# Altium footprint library mylib.PcbLib: 82 footprints (part 2 of 6)
Each footprint in its own frame and in the unit in brackets; x right, y up, seen from the top. Pads: shape width x height; smd on the part's side, far side on the other; paste and mask are expansions set on the pad; w line width, h text height; cw(c..) or ccw(c..) is an arc to the next point about the centre after c.
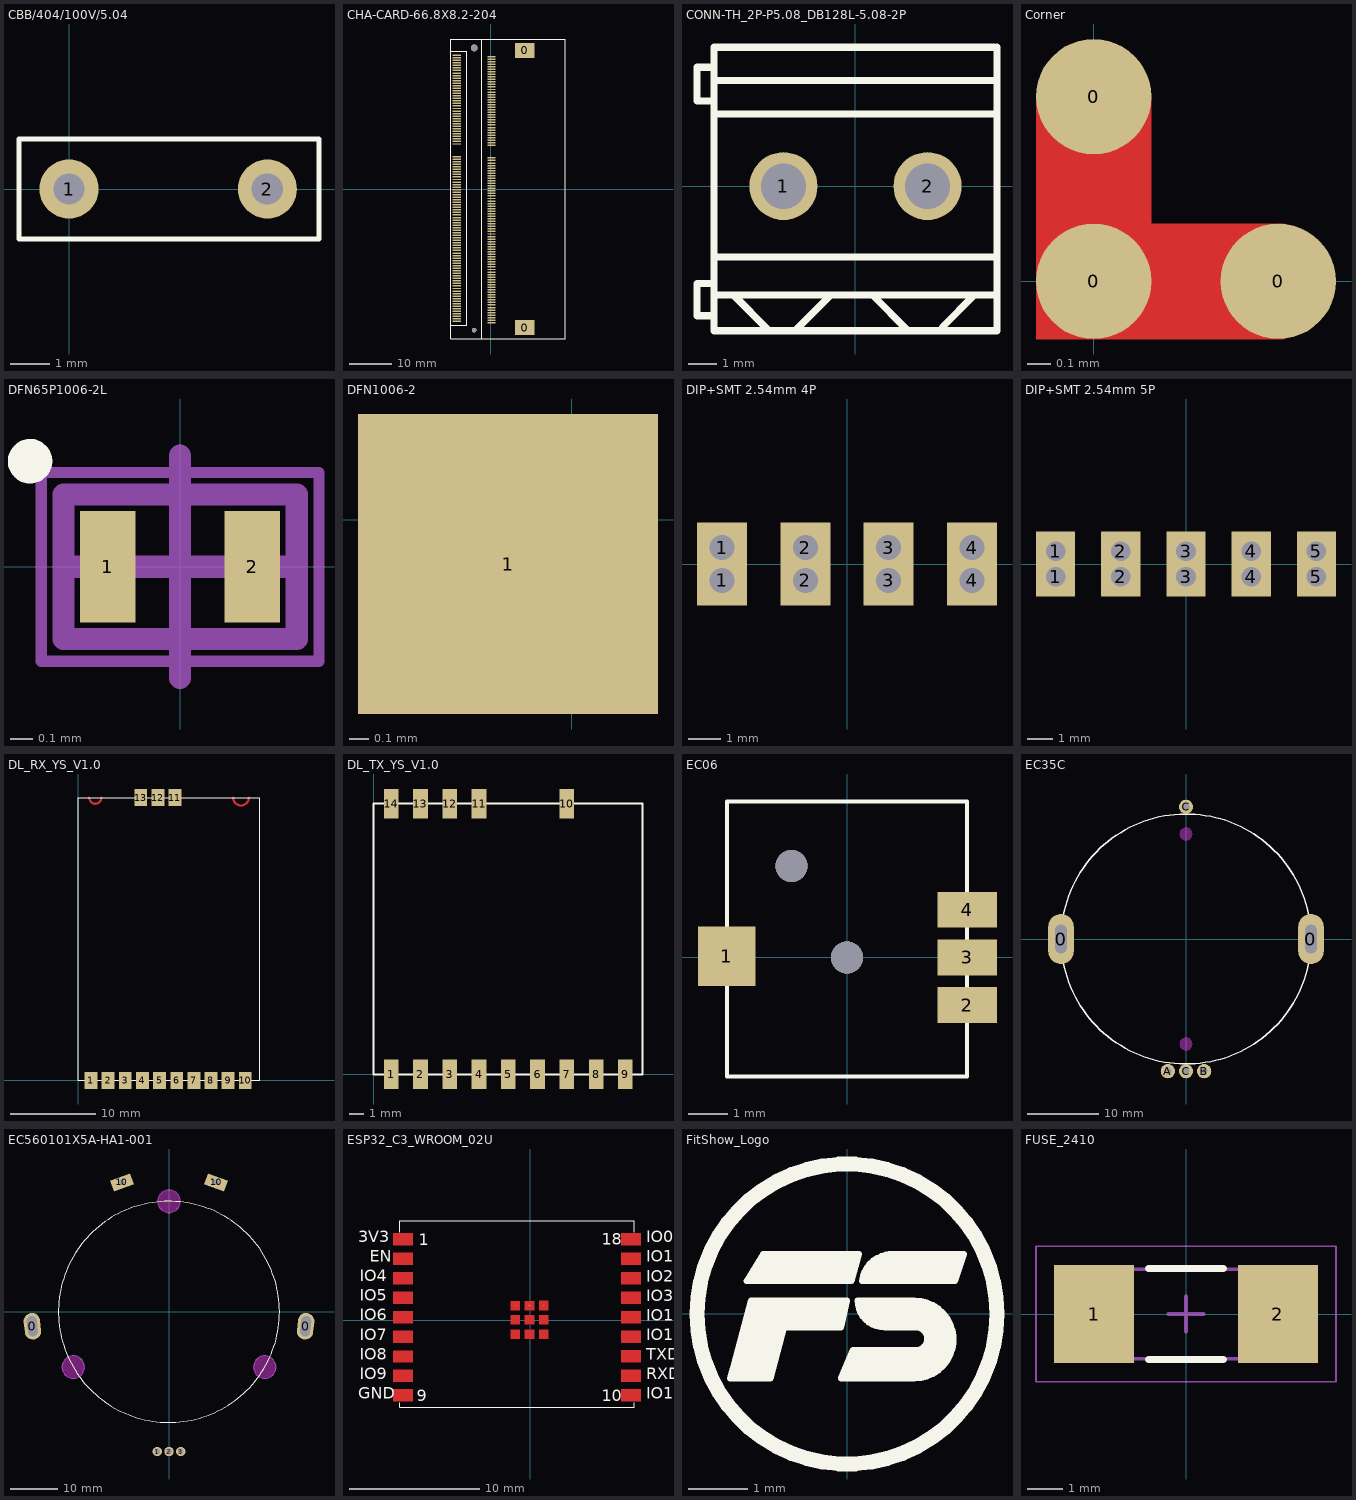
[diagram p1: the footprints below, top view; thin cyan lines are the x and y axes]

## CBB/404/100V/5.04 [mm]
pads (2):
  round 1.5 hole 0.8: 1(0,0) 2(5.04,0)
Top Overlay:
  lines w0.127: -1.27,-1.27 6.35,-1.27 6.35,1.27 -1.27,1.27 -1.27,-1.27

## CHA-CARD-66.8X8.2-204 [mm]
pads (208):
  rect 4.6x3.5 smd: 0(8.05,-32.8) 0(8.05,32.801)
  rect 2x0.35 smd: 1(-8.05,31.65) 2(0.15,31.351) 3(-8.05,31.05) 4(0.15,30.75) 5(-8.05,30.45) 6(0.15,30.149) 7(-8.05,29.85) 8(0.15,29.55) 9(-8.05,29.25) 10(0.15,28.95) 11(-8.05,28.65) 12(0.15,28.351) 13(-8.05,28.05) 14(0.15,27.75) 15(-8.05,27.45) 16(0.15,27.15) 17(-8.05,26.85) 18(0.15,26.55) 19(-8.05,26.25) 20(0.15,25.951) 21(-8.05,25.65) 22(0.15,25.35) 23(-8.05,25.05) 24(0.15,24.749) 25(-8.05,24.45) 26(0.15,24.15) 27(-8.05,23.85) 28(0.15,23.55) 29(-8.05,23.25) 30(0.15,22.951) 31(-8.05,22.65) 32(0.15,22.35) 33(-8.05,22.05) 34(0.15,21.75) 35(-8.05,21.45) 36(0.15,21.15) 37(-8.05,20.85) 38(0.15,20.551) 39(-8.05,20.25) 40(0.15,19.95) 41(-8.05,19.65) 42(0.15,19.349) 43(-8.05,19.05) 44(0.15,18.75) 45(-8.05,18.45) 46(0.15,18.15) 47(-8.05,17.85) 48(0.15,17.551) 49(-8.05,17.25) 50(0.15,16.95) 51(-8.05,16.65) 52(0.15,16.349) 53(-8.05,16.05) 54(0.15,15.75) 55(-8.05,15.45) 56(0.15,15.151) 57(-8.05,14.85) 58(0.15,14.55) 59(-8.05,14.25) 60(0.15,13.949) 61(-8.05,13.65) 62(0.15,13.35) 63(-8.05,13.05) 64(0.15,12.75) 65(-8.05,12.45) 66(0.15,12.151) 67(-8.05,11.85) 68(0.15,11.55) 69(-8.05,11.25) 70(0.15,10.949) 71(-8.05,10.65) 72(0.15,10.35) 73(-8.05,7.65) 74(0.15,7.35) 75(-8.05,7.05) 76(0.15,6.751) 77(-8.05,6.45) 78(0.15,6.15) 79(-8.05,5.85) 80(0.15,5.549) 81(-8.05,5.25) 82(0.15,4.95) 83(-8.05,4.65) 84(0.15,4.351) 85(-8.05,4.05) 86(0.15,3.751) 87(-8.05,3.45) 88(0.15,3.149) 89(-8.05,2.85) 90(0.15,2.55) 91(-8.05,2.25) 92(0.15,1.95) 93(-8.05,1.65) 94(0.15,1.351) 95(-8.05,1.05) 96(0.15,0.75) 97(-8.05,0.45) 98(0.15,0.149) 99(-8.05,-0.15) 100(0.15,-0.45) 101(-8.05,-0.75) 102(0.15,-1.05) 103(-8.05,-1.35) 104(0.15,-1.649) 105(-8.05,-1.95) 106(0.15,-2.25) 107(-8.05,-2.55) 108(0.15,-2.85) 109(-8.05,-3.15) 110(0.15,-3.45) 111(-8.05,-3.75) 112(0.15,-4.049) 113(-8.05,-4.35) 114(0.15,-4.65) 115(-8.05,-4.95) 116(0.15,-5.251) 117(-8.05,-5.55) 118(0.15,-5.85) 119(-8.05,-6.15) 120(0.15,-6.45) 121(-8.05,-6.75) 122(0.15,-7.049) 123(-8.05,-7.35) 124(0.15,-7.65) 125(-8.05,-7.95) 126(0.15,-8.25) 127(-8.05,-8.55) 128(0.15,-8.85) 129(-8.05,-9.15) 130(0.15,-9.449) 131(-8.05,-9.75) 132(0.15,-10.05) 133(-8.05,-10.35) 134(0.15,-10.651) 135(-8.05,-10.95) 136(0.15,-11.25) 137(-8.05,-11.55) 138(0.15,-11.85) 139(-8.05,-12.15) 140(0.15,-12.449) 141(-8.05,-12.75) 142(0.15,-13.05) 143(-8.05,-13.35) 144(0.15,-13.65) 145(-8.05,-13.95) 146(0.15,-14.25) 147(-8.05,-14.55) 148(0.15,-14.849) 149(-8.05,-15.15) 150(0.15,-15.45) 151(-8.05,-15.75) 152(0.15,-16.051) 153(-8.05,-16.35) 154(0.15,-16.65) 155(-8.05,-16.95) 156(0.15,-17.25) 157(-8.05,-17.55) 158(0.15,-17.849) 159(-8.05,-18.15) 160(0.15,-18.45) 161(-8.05,-18.75) 162(0.15,-19.051) 163(-8.05,-19.35) 164(0.15,-19.65) 165(-8.05,-19.95) 166(0.15,-20.249) 167(-8.05,-20.55) 168(0.15,-20.85) 169(-8.05,-21.15) 170(0.15,-21.451) 171(-8.05,-21.75) 172(0.15,-22.05) 173(-8.05,-22.35) 174(0.15,-22.65) 175(-8.05,-22.95) 176(0.15,-23.249) 177(-8.05,-23.55) 178(0.15,-23.85) 179(-8.05,-24.15) 180(0.15,-24.451) 181(-8.05,-24.75) 182(0.15,-25.05) 183(-8.05,-25.35) 184(0.15,-25.649) 185(-8.05,-25.95) 186(0.15,-26.249) 187(-8.05,-26.55) 188(0.15,-26.851) 189(-8.05,-27.15) 190(0.15,-27.45) 191(-8.05,-27.75) 192(0.15,-28.05) 193(-8.05,-28.35) 194(0.15,-28.649) 195(-8.05,-28.95) 196(0.15,-29.25) 197(-8.05,-29.55) 198(0.15,-29.851) 199(-8.05,-30.15) 200(0.15,-30.45) 201(-8.05,-30.75) 202(0.15,-31.049) 203(-8.05,-31.35) 204(0.15,-31.649)
  round 1.1 hole 1.1 unplated: ""(-3.95,-33.4)
  round 1.6 hole 1.6 unplated: ""(-3.95,33.4)
Top Overlay:
  lines w0.254: -9.35,-32.25 -5.75,-32.25 -5.75,32.55 -9.35,32.55 ; -2.15,-35.4 -2.15,35.5 ; -9.45,-35.5 -9.45,35.5 17.55,35.5 17.55,-35.5 -9.45,-35.5

## CONN-TH_2P-P5.08_DB128L-5.08-2P [mm]
pads (2):
  round 2.4 hole 1.6: 1(-2.54,0) 2(2.54,0)
Top Overlay:
  lines w0.254: -4.99,-5.1 -4.99,4.9 4.9,4.9 ; -4.99,-3.838 4.99,-3.838 ; -4.99,-2.469 -4.956,-2.503 4.99,-2.503 ; -4.99,2.54 4.99,2.54 ; -4.99,3.729 4.99,3.729 ; -4.988,-4.572 -5.588,-4.572 -5.588,-3.428 -4.988,-3.428 ; -4.988,3.003 -5.588,3.003 -5.588,4.192 -4.988,4.192 ; -4.96,-5.1 4.99,-5.1 4.99,4.9 ; -4.277,-3.838 -4.277,-3.866 -3.083,-5.06 ; -2.092,-5.06 -2.092,-5.057 -0.873,-3.838 ; 0.473,-3.838 0.597,-3.838 1.819,-5.06 ; 3.064,-5.06 3.064,-4.962 4.187,-3.838

## Corner [mm]
pads (3):
  round 0.5 all layers, no hole: 0(0,0) 0(0,0.8) 0(0.8,0)
Top Layer:
  region: -0.25,-0.25 -0.25,0.8 0.25,0.8 0.25,0.25 0.825,0.25 0.825,-0.25
Top Solder:
  region: -0.25,-0.25 -0.25,0.8 0.25,0.8 0.25,0.25 0.825,0.25 0.825,-0.25

## DFN65P1006-2L [mm] "DFN, 2-Leads, Body 0.60x1.00mm, Pitch 0.65mm, IPC High Density"
height 0.5
pads (2):
  rect 0.25x0.5 smd: 1(-0.325,0) 2(0.325,0)
Top Overlay:
  circle w0.1: c-0.675,0.475 r0.05
Mechanical 13:
  lines w0.1: -0.525,-0.325 -0.525,0.325 0.525,0.325 0.525,-0.325 -0.525,-0.325
Mechanical 15:
  lines w0.05: -0.625,-0.425 -0.625,0.425 0.625,0.425 0.625,-0.425 -0.625,-0.425
  lines w0.1: -0.5,0 0.5,0 ; 0,-0.5 0,0.5
3D body: height 0.5, standoff 0.02, extent -0.525,-0.325 0.525,0.325

## DFN1006-2 [mm]
pads (1):
  rect 1.524x1.524 smd: 1(-0.325,-0.225)

## DIP+SMT 2.54mm 4P [mil]
pads (8):
  rect 60x60 hole 30: 1(-150,-19.68) 1(-150,19.69) 2(-50,-19.68) 2(-50,19.69) 3(50,-19.68) 3(50,19.69) 4(150,-19.68) 4(150,19.69)

## DIP+SMT 2.54mm 5P [mil]
pads (10):
  rect 60x60 hole 30: 1(-200,-19.53) 1(-200,19.84) 2(-100,-19.53) 2(-100,19.84) 3(0,-19.53) 3(0,19.84) 4(100,-19.53) 4(100,19.84) 5(200,-19.84) 5(200,19.53)

## DL_RX_YS_V1.0 [mm]
pads (13):
  rect 1.5x2 smd: 1(1.5,0) 2(3.5,0) 3(5.5,0) 4(7.5,0) 5(9.5,0) 6(11.5,0) 7(13.5,0) 8(15.5,0) 9(17.5,0) 10(19.5,0) 11(11.3,33) 12(9.3,33) 13(7.3,33)
Top Layer:
  lines w0.254: 1.282,33 ccw(c2,33) 2.718,33 ; 18.084,33 ccw(c19,33) 19.916,33
Top Overlay:
  lines w0.127: 0,0 0,33 21.2,33 21.2,0 0,0
3D body: height 1, standoff 0, extent 0,0 21.209,33.02

## DL_TX_YS_V1.0 [mm]
pads (14):
  rect 1x2 smd: 1(1.2,0) 2(3.2,0) 3(5.2,0) 4(7.2,0) 5(9.2,0) 6(11.2,0) 7(13.2,0) 8(15.2,0) 9(17.2,0) 10(13.2,18.5) 11(7.2,18.5) 12(5.2,18.5) 13(3.2,18.5) 14(1.2,18.5)
Top Overlay:
  lines w0.127: 0,0 18.36,0 18.36,18.5 0,18.5 0,0

## EC06 [mm]
pads (4):
  rect 1.45x1.5 smd: 1(-3.025,0.025)
  rect 1.5x0.9 smd: 2(3.025,-1.2) 3(3.025,0) 4(3.025,1.2)
via 0,0 diameter 0.8 hole 0.8
via -1.4,2.3 diameter 0.8 hole 0.8
Top Overlay:
  lines w0.1: -3.025,-3 -3.025,3.925 ; -3,-3 3.025,-3 3.025,3.925 -3,3.925

## EC35C [mm]
pads (6):
  oval 3.6x7 hole 1.6 slot 4 at 90 deg: 0(-17.5,0) 0(17.5,0)
  round 2 hole 1: A(-2.54,-18.5) B(2.54,-18.5) C(0,-18.5) C(0,18.5)
Top Overlay:
  circle w0.2: c0,0 r17.5
Keep-Out Layer:
  board cut-out: 0,-13.85 0.083,-13.851 0.246,-13.886 0.4,-13.951 0.538,-14.044 0.656,-14.162 0.749,-14.3 0.814,-14.454 0.849,-14.617 0.85,-14.7 0.85,-14.784 0.817,-14.948 0.753,-15.103 0.66,-15.242 0.542,-15.36 0.403,-15.453 0.248,-15.517 0.084,-15.55 0,-15.55 -0.084,-15.55 -0.248,-15.517 -0.403,-15.453 -0.542,-15.36 -0.66,-15.242 -0.753,-15.103 -0.817,-14.948 -0.85,-14.784 -0.85,-14.7 -0.85,-14.616 -0.817,-14.452 -0.753,-14.297 -0.66,-14.158 -0.542,-14.04 -0.403,-13.947 -0.248,-13.883 -0.084,-13.85
  board cut-out: 0,15.55 0.083,15.549 0.246,15.514 0.4,15.449 0.538,15.356 0.656,15.238 0.749,15.1 0.814,14.946 0.849,14.783 0.85,14.7 0.85,14.616 0.817,14.452 0.753,14.297 0.66,14.158 0.542,14.04 0.403,13.947 0.248,13.883 0.084,13.85 0,13.85 -0.084,13.85 -0.248,13.883 -0.403,13.947 -0.542,14.04 -0.66,14.158 -0.753,14.297 -0.817,14.452 -0.85,14.616 -0.85,14.7 -0.85,14.784 -0.817,14.948 -0.753,15.103 -0.66,15.242 -0.542,15.36 -0.403,15.453 -0.248,15.517 -0.084,15.55
Keep-Out Layer:
  circle w0.127: c0,14.7 r0.85
  circle w0.127: c0,-14.7 r0.85

## EC560101X5A-HA1-001 [mm]
pads (7):
  oval 5.7x3.5 hole 2.1 slot 4.3 at 96 deg rot 96: 0(-29.04,-3.052)
  oval 5.7x3.5 hole 2.1 slot 4.3 at 84 deg rot 84: 0(29.04,-3.052)
  round 2 hole 1.2: 1(-2.5,-29.7) 2(0,-29.7) 3(2.5,-29.7)
  rect 4.5x2.5 hole 1.2 square rot 20: 10(-10.021,27.533)
  rect 4.5x2.5 hole 1.2 square rot 160: 10(10.021,27.533)
Top Overlay:
  circle w0.2: c0,0 r23.5
Keep-Out Layer:
  board cut-out: 17.95,-11.75 17.95,-11.986 18.042,-12.45 18.223,-12.887 18.486,-13.28 18.82,-13.614 19.213,-13.877 19.65,-14.058 20.114,-14.15 20.35,-14.15 20.586,-14.15 21.05,-14.058 21.487,-13.877 21.88,-13.614 22.214,-13.28 22.477,-12.887 22.658,-12.45 22.75,-11.986 22.75,-11.75 22.75,-11.514 22.658,-11.05 22.477,-10.613 22.214,-10.22 21.88,-9.886 21.487,-9.623 21.05,-9.442 20.586,-9.35 20.35,-9.35 20.114,-9.35 19.65,-9.442 19.213,-9.623 18.82,-9.886 18.486,-10.22 18.223,-10.613 18.042,-11.05 17.95,-11.514
  board cut-out: -20.35,-14.15 -20.586,-14.15 -21.05,-14.058 -21.487,-13.877 -21.88,-13.614 -22.214,-13.28 -22.477,-12.887 -22.658,-12.45 -22.75,-11.986 -22.75,-11.75 -22.75,-11.514 -22.658,-11.05 -22.477,-10.613 -22.214,-10.22 -21.88,-9.886 -21.487,-9.623 -21.05,-9.442 -20.586,-9.35 -20.35,-9.35 -20.114,-9.35 -19.65,-9.442 -19.213,-9.623 -18.82,-9.886 -18.486,-10.22 -18.223,-10.613 -18.042,-11.05 -17.95,-11.514 -17.95,-11.75 -17.95,-11.986 -18.042,-12.45 -18.223,-12.887 -18.486,-13.28 -18.82,-13.614 -19.213,-13.877 -19.65,-14.058 -20.114,-14.15
  board cut-out: 0,21.1 -0.236,21.1 -0.7,21.192 -1.137,21.373 -1.53,21.636 -1.864,21.97 -2.127,22.363 -2.308,22.8 -2.4,23.264 -2.4,23.5 -2.4,23.736 -2.308,24.2 -2.127,24.637 -1.864,25.03 -1.53,25.364 -1.137,25.627 -0.7,25.808 -0.236,25.9 0,25.9 0.236,25.9 0.7,25.808 1.137,25.627 1.53,25.364 1.864,25.03 2.127,24.637 2.308,24.2 2.4,23.736 2.4,23.5 2.4,23.264 2.308,22.8 2.127,22.363 1.864,21.97 1.53,21.636 1.137,21.373 0.7,21.192 0.236,21.1
Mechanical 1:
  circle w0.2: c20.35,-11.75 r2.4
  circle w0.2: c-20.35,-11.75 r2.4
  circle w0.2: c0,23.5 r2.4

## ESP32_C3_WROOM_02U [mil]
pads (27):
  round 1 smd: 0(-45.28,-42.44) 0(-45.28,0.87) 0(-45.28,44.17) 0(-2.01,-42.44) 0(-2.01,0.89) 0(-2.01,44.17) 0(41.29,-42.44) 0(41.29,0.91) 0(41.29,44.2) 1(-384.22,245.02) 2(-384.22,185.97) 3(-384.22,126.91) 4(-384.22,67.86) 5(-384.22,8.8) 6(-384.22,-50.25) 7(-384.22,-109.49) 8(-384.22,-168.36) 9(-384.22,-227.42) 10(304.76,-227.42) 11(304.76,-168.36) 12(304.76,-109.31) 13(304.76,-50.25) 14(304.76,8.8) 15(304.76,67.86) 16(304.76,126.91) 17(304.76,185.97) 18(304.76,245.02)
Top Layer:
  region: -413.74,109.2 -413.74,144.63 -354.69,144.63 -354.69,109.2
  region: 275.23,-186.08 275.23,-150.65 334.29,-150.65 334.29,-186.08
  region: -59.06,30.42 -59.06,57.93 -31.5,57.93 -31.5,30.42
  region: -15.75,30.42 -15.75,57.93 11.72,57.93 11.72,30.42
  region: 27.47,57.98 55.12,57.98 55.12,30.42 27.47,30.42
  region: -59.06,-12.84 -31.5,-12.94 -31.5,14.67 -59.06,14.67
  region: -15.75,-56.24 11.72,-56.24 11.72,-28.64 -15.75,-28.64
  region: 27.47,-56.24 55.12,-56.24 55.12,-28.64 27.47,-28.64
  region: 27.47,-12.89 27.47,14.62 55.12,14.72 55.12,-12.89
  region: -59.06,-56.24 -59.06,-28.64 -31.5,-28.64 -31.5,-56.24
  region: -15.75,-12.89 11.72,-12.89 11.72,14.67 -15.75,14.67
  region: 275.23,-245.14 334.29,-245.14 334.29,-209.7 275.23,-209.7
  region: 275.23,-127.03 275.23,-91.59 334.29,-91.59 334.29,-127.03
  region: 275.23,-67.97 275.23,-32.54 334.29,-32.54 334.29,-67.97
  region: 275.23,-8.91 334.29,-8.91 334.29,26.52 275.23,26.52
  region: 275.23,50.14 275.23,85.57 334.29,85.57 334.29,50.14
  region: 275.23,109.2 275.23,144.63 334.29,144.63 334.29,109.2
  region: 275.23,168.25 334.29,168.25 334.29,203.68 275.23,203.68
  region: 275.23,227.31 275.23,262.74 334.29,262.74 334.29,227.31
  region: -413.74,-245.14 -413.74,-209.7 -354.69,-209.7 -354.69,-245.14
  region: -413.74,-186.08 -354.69,-186.08 -354.69,-150.65 -413.74,-150.65
  region: -413.74,-127.21 -413.74,-91.78 -354.69,-91.78 -354.69,-127.21
  region: -413.74,-67.97 -354.69,-67.97 -354.69,-32.54 -413.74,-32.54
  region: -413.74,-8.91 -413.74,26.52 -354.69,26.52 -354.69,-8.91
  region: -413.74,50.14 -413.74,85.57 -354.69,85.57 -354.69,50.14
  region: -413.74,168.25 -354.69,168.25 -354.69,203.68 -413.74,203.68
  region: -413.74,227.31 -413.74,262.74 -354.69,262.74 -354.69,227.31
Top Overlay:
  lines w0.5: -394.06,-249.07 -394.06,-262.85 314.6,-262.85 314.6,-249.07 ; -394.06,266.68 -394.06,300.14 314.6,300.14 314.6,266.68
  text "IO9" at -514.77,-178.15 h35.43
  text "IO8" at -514.77,-119.09 h35.43
  text "IO7" at -514.77,-60.04 h35.43
  text "IO6" at -514.77,-0.98 h35.43
  text "IO5" at -514.77,58.07 h35.43
  text "IO4" at -514.77,117.13 h35.43
  text "IO10" at 351.38,-238.19 h35.43
  text "IO18" at 351.38,-60.65 h35.43
  text "IO19" at 351.38,-1.48 h35.43
  text "IO3" at 351.38,57.7 h35.43
  text "IO2" at 351.38,116.88 h35.43
  text "IO1" at 351.38,176.06 h35.43
  text "IO0" at 351.38,235.24 h35.43
  text "TXD" at 351.38,-119.83 h35.43
  text "RXD" at 351.38,-179.01 h35.43
  text "GND" at -520.67,-237.2 h35.43
  text "EN" at -485.25,176.18 h35.43
  text "3V3" at -520.67,235.24 h35.43
  text "10" at 216.23,-245.14 h35.43
  text "9" at -342.71,-245.14 h35.43
  text "18" at 216.04,227.41 h35.43
  text "1" at -337.59,227.31 h35.43
3D body "ESP32-C3-WROOM-02U 3D Model.STEP": height 125.98, standoff 0, extent -394.09,-262.8 314.57,300.2

## FitShow_Logo [mm]
Top Overlay:
  circle w0.254: c-0.004,-0.003 r2.54
  region: -1.63,0.226 -0.004,0.226 -0.106,-0.232 -1.071,-0.232 -1.299,-1.095 -1.985,-1.095
  region: -1.426,1.013 0.199,1.013 0.072,0.556 -1.706,0.556
  region: 1.825,0.556 1.977,1.013 0.707,1.013 0.621,1.013 0.463,0.947 0.341,0.826 0.275,0.667 0.275,0.581 0.275,0.556
  region: 0.199,0.2 0.199,0.114 0.265,-0.044 0.386,-0.166 0.545,-0.232 0.631,-0.232 1.215,-0.232 1.245,-0.235 1.3,-0.257 1.342,-0.299 1.365,-0.354 1.368,-0.384 1.368,-0.409 1.364,-0.449 1.333,-0.522 1.277,-0.578 1.204,-0.609 1.164,-0.613 0.098,-0.613 -0.08,-1.095 1.215,-1.095 1.326,-1.095 1.532,-1.01 1.689,-0.853 1.774,-0.648 1.774,-0.536 1.774,-0.308 1.774,-0.207 1.697,-0.02 1.554,0.123 1.367,0.2 1.266,0.2
  lines w0.102: -1.96,-1.019 -1.63,0.226 -0.004,0.226 -0.106,-0.232 -1.071,-0.232 -1.299,-1.095 -1.985,-1.095 -1.934,-0.917 ; 0.25,0.556 1.825,0.556 1.977,1.013 0.707,1.013 0.834,1.013 ; 0.253,0.556 cw(c0.758,0.505) 0.733,1.012 ; -1.706,0.556 0.072,0.556 0.199,1.013 -1.426,1.013 -1.706,0.556 ; -0.106,-1.095 1.139,-1.095 ccw(c1.139,-0.435) 1.139,0.226 0.174,0.226 ccw(c0.631,0.226) 0.631,-0.232 1.164,-0.232 cw(c1.164,-0.422) 1.164,-0.613 0.098,-0.613 -0.106,-1.095

## FUSE_2410 [mm] "Chip Capacitor, 2-Leads, Body 6.10x2.50mm, IPC Low Density"
height 2.5
pads (2):
  rect 2.25x2.75 smd: 1(-2.575,0) 2(2.575,0)
Top Overlay:
  lines w0.2: -1.05,-1.275 1.05,-1.275 ; -1.05,1.275 1.05,1.275
Mechanical 13:
  lines w0.1: -3.15,-1.255 -3.15,1.255 3.15,1.255 3.15,-1.255 -3.15,-1.255
Mechanical 15:
  lines w0.05: -4.2,-1.9 -4.2,1.9 4.2,1.9 4.2,-1.9 -4.2,-1.9
  lines w0.1: -0.5,0 0.5,0 ; 0,-0.5 0,0.5
3D body "FUSE_2410.step": height 2.5, standoff 0, extent -3.15,-1.255 3.15,1.255